# Altium footprint library Electronic Devices_LIB.PcbLib: 410 footprints (part 8 of 26)
Each footprint in its own frame and in the unit in brackets; x right, y up, seen from the top. Pads: shape width x height; smd on the part's side, far side on the other; paste and mask are expansions set on the pad; w line width, h text height; cw(c..) or ccw(c..) is an arc to the next point about the centre after c.
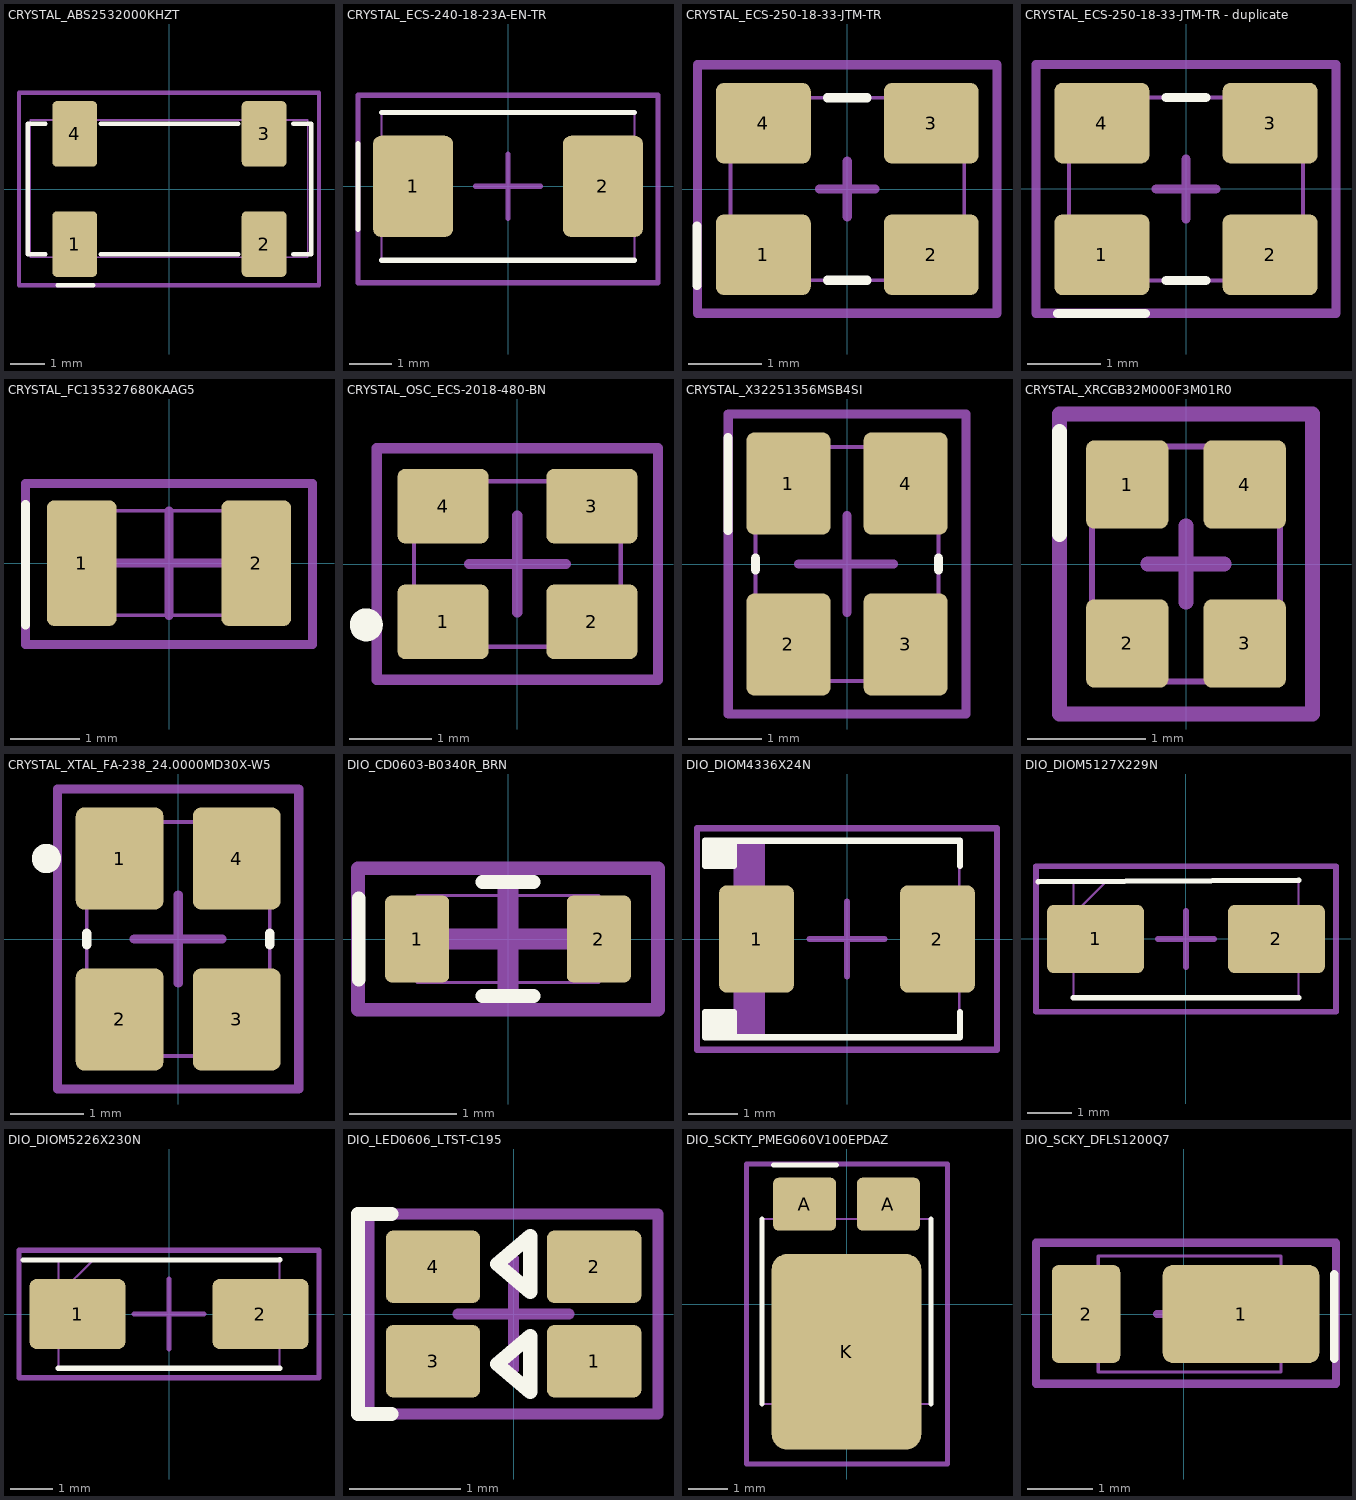
[diagram p7: the footprints below, top view; thin cyan lines are the x and y axes]

## CRYSTAL_ABS2532000KHZT [mm] "0.315\" L x 0.150\" W (8.00mm x 3.80mm)"
height 2.5
pads (4):
  rrect20% 1.3x1.9 smd: 1(-2.75,-1.6) 2(2.75,-1.6) 3(2.75,1.6) 4(-2.75,1.6)
Top Overlay:
  lines w0.127: -3.6,-1.9 -4.115,-1.9 -4.115,1.9 -3.6,1.9 ; -3.251,-2.794 -2.21,-2.794 ; -2,-1.9 2,-1.9 ; -2,1.9 2,1.9 ; 3.6,-1.9 4.115,-1.9 4.115,1.9 3.6,1.9
Top Assembly:
  lines w0.051: -4.039,-1.981 4.013,-1.981 4.013,2.007 -4.039,2.007 -4.039,-1.981
  text ".Designator" at -2.489,-0.136 h0.51
Top Courtyard:
  lines w0.127: -4.369,-2.794 -4.369,2.794 4.343,2.794 4.343,-2.794 -4.369,-2.794
3D body "ABS25-32.000KHZ-T.stp": height 1.25, standoff -1.41, extent -4,-2 4,2

## CRYSTAL_ECS-240-18-23A-EN-TR [mm]
pads (2):
  rrect20% 1.9x2.4 smd: 1(-2.25,0) 2(2.25,0)
Top Overlay:
  lines w0.127: -3.556,-1.016 -3.556,1.016 ; -3,-1.75 3,-1.75 ; -3,1.75 3,1.75
Top Assembly:
  lines w0.051: -3,-1.75 3,-1.75 3,1.75 -3,1.75 -3,-1.75
  text ".Designator" at -2.489,-0.034 h0.51
Top Courtyard:
  lines w0.127: -0.762,0 0,0 ; 0,-0.762 0,0 ; 0,0.762 0,0 ; 0.762,0 0,0 ; -3.556,-2.286 -3.556,2.159 3.556,2.159 3.556,-2.286 -3.556,-2.286
3D body "ECS-240-18-23A-EN-TR.STEP": height 1.11, standoff 0.01, extent -3,-1.75 3,1.75

## CRYSTAL_ECS-250-18-33-JTM-TR [mm] "0.126\" L x 0.098\" W (3.20mm x 2.50mm)"
height 0.8
pads (4):
  rrect20% 1.3x1.1 smd: 1(-1.15,-0.9) 2(1.15,-0.9) 3(1.15,0.9) 4(-1.15,0.9)
Top Overlay:
  lines w0.127: -2.057,-1.321 -2.057,-0.508 ; -0.27,-1.25 0.27,-1.25 ; -0.27,1.25 0.27,1.25
Top Assembly:
  lines w0.051: -1.6,-1.25 -1.6,1.25 1.6,1.25 1.6,-1.25 -1.6,-1.25
  text ".Designator" at -2.667,-0.186 h0.51
Top Courtyard:
  lines w0.127: -0.381,0 0,0 ; 0,-0.381 0,0 ; 0,0.381 0,0 ; 0.381,0 0,0 ; -2.05,-1.7 -2.05,1.7 2.05,1.7 2.05,-1.7 -2.05,-1.7
3D body "ECS-250-18-33-JTM-TR.STEP": height 0.81, standoff 0.01, extent -1.6,-1.25 1.6,1.25

## CRYSTAL_ECS-250-18-33-JTM-TR - duplicate [mm] "0.063\" L x 0.047\" W (1.60mm x 1.20mm)"
height 0.4
pads (4):
  rrect20% 1.3x1.1 smd: 1(-1.15,-0.9) 2(1.15,-0.9) 3(1.15,0.9) 4(-1.15,0.9)
Top Overlay:
  lines w0.127: -1.753,-1.702 -0.559,-1.702 ; -0.27,-1.25 0.27,-1.25 ; -0.27,1.25 0.27,1.25
Top Assembly:
  lines w0.051: -1.6,-1.25 1.6,-1.25 1.6,1.25 -1.6,1.25 -1.6,-1.25
  text ".Designator" at -2.667,-0.11 h0.51
Top Courtyard:
  lines w0.127: -0.406,0 0,0 ; 0,-0.406 0,0 ; 0,0.406 0,0 ; 0.406,0 0,0 ; -2.05,-1.7 2.05,-1.7 2.05,1.7 -2.05,1.7 -2.05,-1.7
3D body "ABM12W-40.0000MHZ-6-B1U-T3--3DModel-STEP-400430.STEP": height 0.41, standoff 0.01, extent -0.749,-0.6 0.851,0.6

## CRYSTAL_FC135327680KAAG5 [mm] "2-SMD, No Lead 0.126\" L x 0.059\" W (3.20mm x 1.50mm)"
height 0.9
pads (2):
  rrect20% 1x1.8 smd: 1(-1.25,0) 2(1.25,0)
Top Overlay:
  lines w0.127: -2.057,-0.889 -2.057,0.838
Top Assembly:
  lines w0.051: -1.6,-0.75 1.6,-0.75 1.6,0.75 -1.6,0.75 -1.6,-0.75
  text ".Designator" at -2.54,-0.136 h0.51
Top Courtyard:
  lines w0.127: -0.75,0 0,0 ; 0,-0.75 0,0 ; 0,0.75 0,0 ; 0.75,0 0,0 ; -2.057,-1.168 2.057,-1.168 2.057,1.143 -2.057,1.143 -2.057,-1.168
3D body "FC-135_32.7680KA-AG5.stp": height 0.9, standoff 0, extent -1.6,-0.75 1.6,0.75

## CRYSTAL_OSC_ECS-2018-480-BN [mm]
pads (4):
  rrect20% 1.1x0.9 smd: 1(-0.9,-0.7) 2(0.9,-0.7) 3(0.9,0.7) 4(-0.9,0.7)
Top Overlay:
  circle w0.2: c-1.829,-0.737 r0.1
Top Assembly:
  lines w0.051: -1.25,-1 -1.25,1 1.25,1 1.25,-1 -1.25,-1
  text ".Designator" at -2.565,-0.136 h0.51
Top Courtyard:
  lines w0.127: -0.584,0 0,0 ; 0,-0.584 0,0 ; 0,0.584 0,0 ; 0.584,0 0,0 ; -1.7,-1.4 1.7,-1.4 1.7,1.4 -1.7,1.4 -1.7,-1.4
3D body "step_temp.STEP": height 1, standoff 0, extent -1.25,-1 1.25,1

## CRYSTAL_X32251356MSB4SI [mm] "Dimensions:3.20 x 2.50 x 0.70 mm"
height 0.75
pads (4):
  rrect20% 1.15x1.4 smd: 1(-0.8,1.1) 2(-0.8,-1.1) 3(0.8,-1.1) 4(0.8,1.1)
Top Overlay:
  lines w0.127: -1.626,0.457 -1.626,1.727 ; -1.25,-0.08 -1.25,0.08 ; 1.25,-0.08 1.25,0.08
Top Assembly:
  lines w0.051: -1.25,-1.6 -1.25,1.6 1.25,1.6 1.25,-1.6 -1.25,-1.6
  text ".Designator" at -2.413,-0.136 h0.51
Top Courtyard:
  lines w0.127: -0.66,0 0,0 ; 0,-0.66 0,0 ; 0,0.66 0,0 ; 0.635,0 0,0 ; -1.625,-2.05 -1.625,2.05 1.625,2.05 1.625,-2.05 -1.625,-2.05
3D body "step_temp.STEP": height 0.75, standoff 0, extent -1.25,-1.6 1.25,1.6

## CRYSTAL_XRCGB32M000F3M01R0 [mm] "0.079\" L x 0.063\" W (2.00mm x 1.60mm)"
height 0.7
pads (4):
  rrect20% 0.7x0.75 smd: 1(-0.5,0.675) 2(-0.5,-0.675) 3(0.5,-0.675) 4(0.5,0.675)
Top Overlay:
  lines w0.127: -1.075,0.25 -1.075,1.125
Top Assembly:
  lines w0.051: -0.8,-1 0.8,-1 0.8,1 -0.8,1 -0.8,-1
  text ".Designator" at -2.499,-0.13 h0.51
Top Courtyard:
  lines w0.127: -0.325,0 0,0 ; 0,-0.325 0,0 ; 0,0.325 0,0 ; 0.325,0 0,0 ; -1.075,-1.275 -1.075,1.275 1.075,1.275 1.075,-1.275 -1.075,-1.275
3D body "step_temp.STEP": height 0.7, standoff 0, extent -0.8,-1 0.8,1

## CRYSTAL_XTAL_FA-238_24.0000MD30X-W5 [mm]
height 0.7
pads (4):
  rrect20% 1.2x1.4 smd: 1(-0.8,1.1) 2(-0.8,-1.1) 3(0.8,-1.1) 4(0.8,1.1)
Top Overlay:
  circle w0.2: c-1.8,1.1 r0.1
  lines w0.127: -1.25,-0.08 -1.25,0.08 ; 1.25,-0.08 1.25,0.08
Top Assembly:
  lines w0.051: -1.25,-1.6 -1.25,1.6 1.25,1.6 1.25,-1.6 -1.25,-1.6
Top Courtyard:
  lines w0.127: -0.6,0 0,0 ; 0,-0.6 0,0 ; 0,0.6 0,0 ; 0.6,0 0,0 ; -1.65,-2.05 -1.65,2.05 1.65,2.05 1.65,-2.05 -1.65,-2.05
3D body "step_temp.STEP": height 0.7, standoff 0, extent -1.25,-1.6 1.25,1.6

## DIO_CD0603-B0340R_BRN [mm]
pads (2):
  rrect20% 0.6x0.813 smd: 1(-0.85,0) 2(0.85,0)
Top Overlay:
  lines w0.127: -1.397,-0.381 -1.397,0.381 ; -0.242,-0.533 0.242,-0.533 ; -0.242,0.533 0.242,0.533
Top Assembly:
  text ".Designator" at -2.515,-0.186 h0.51
Top Courtyard:
  lines w0.127: -1.404,-0.66 -1.404,0.66 -1.105,0.66 1.105,0.66 1.404,0.66 1.404,-0.66 1.105,-0.66 -1.105,-0.66 -1.404,-0.66
  lines w0.2: -0.584,0 0,0 ; 0,-0.584 0,0 ; 0,0.584 0,0 ; 0.584,0 0,0
Top 3D Body:
  lines w0.025: -0.851,-0.406 0.851,-0.406 0.851,0.406 -0.851,0.406 -0.851,-0.406
3D body "CD0603-B0340R_BRN.step": height 0.81, standoff 0, extent -0.851,-0.409 0.851,0.409

## DIO_DIOM4336X24N [mm] "MoldeDiode, 2-Leads, Body 4.31x3.62mm, IPC Medium Density"
height 2.44
pads (2):
  rrect20% 1.52x2.18 smd: 1(-1.84,0) 2(1.839,0)
Top Overlay:
  rectangle: -2.889,1.49 -2.3,2
  rectangle: -2.889,-2 -2.3,-1.49
  lines w0.127: 2.3,-1.49 2.3,-2 -2.3,-2 ; 2.3,1.49 2.3,2 -2.3,2 ; -2.3,-2 -2.3,-1.49 -2.889,-1.49 -2.889,-2 -2.3,-2 ; -2.3,2 -2.3,1.49 -2.889,1.49 -2.889,2 -2.3,2
Top Assembly:
  rectangle: -2.285,-1.97 -1.67,1.97
  lines w0.051: -2.285,-1.97 -2.285,1.97 2.285,1.97 2.285,-1.97 -2.285,-1.97
  text ".Designator" at -2.87,-0.161 h0.51
Top Courtyard:
  lines w0.127: -0.762,0 0,0 ; 0,-0.762 0,0 ; 0,0.762 0,0 ; 0.762,0 0,0 ; -3.05,-2.25 -3.05,2.25 3.05,2.25 3.05,-2.25 -3.05,-2.25
3D body "DIOM4336X24N.step": height 2.44, standoff 0, extent -2.505,-1.97 2.505,1.97

## DIO_DIOM5127X229N [mm] "DO-214AC, SMA"
height 2.25
pads (2):
  rrect20% 2.2x1.55 smd: 1(-2.05,0) 2(2.05,0)
Top Overlay:
  lines w0.127: -3.353,1.295 2.552,1.332 ; -2.552,-1.332 2.552,-1.332
Top Assembly:
  text ".Designator" at -2.54,-0.161 h0.51
Top Courtyard:
  lines w0.127: -0.635,0 0,0 ; 0,-0.635 0,0 ; 0,0.635 0,0 ; 0.635,0 0,0 ; -3.4,-1.645 -3.4,1.645 3.4,1.645 3.4,-1.645 -3.4,-1.645
Top 3D Body:
  lines w0.051: -2.552,0.558 -1.778,1.332 ; -2.552,-1.332 -2.552,1.332 2.552,1.332 2.552,-1.332 -2.552,-1.332
3D body "SMAJ5.0A-E3_5A.stp": height 2.29, standoff 0, extent -2.552,-1.332 2.552,1.332

## DIO_DIOM5226X230N [mm] "DO-214AC, SMA"
height 2.9
pads (2):
  rrect20% 2.25x1.65 smd: 1(-2.15,0) 2(2.15,0)
Top Overlay:
  lines w0.127: -3.429,1.27 2.6,1.275 ; -2.6,-1.275 2.6,-1.275
Top Assembly:
  lines w0.051: -2.6,0.45 -1.775,1.275 ; -2.6,-1.275 -2.6,1.275 2.6,1.275 2.6,-1.275 -2.6,-1.275
  text ".Designator" at -2.438,-0.136 h0.51
Top Courtyard:
  lines w0.127: -0.813,0 0,0 ; 0,-0.813 0,0 ; 0,0.813 0,0 ; 0.813,0 0,0 ; -3.525,-1.499 -3.525,1.499 3.525,1.499 3.525,-1.499 -3.525,-1.499
3D body "S1A-E3_61T.stp": height 2.3, standoff 0, extent -2.6,-1.25 2.6,1.3

## DIO_LED0606_LTST-C195 [mm] "Lite-On LED, body 1.60mm L x 1.50mm / 0606 (1616 Metric)"
height 0.8
pads (4):
  rrect20% 0.85x0.65 smd: 1(0.725,-0.425) 2(0.725,0.425) 3(-0.725,-0.425) 4(-0.725,0.425)
Top Overlay:
  lines w0.127: -1.1,-0.9 -1.4,-0.9 -1.4,0.9 -1.1,0.9 ; -0.15,-0.45 0.15,-0.7 0.15,-0.2 -0.15,-0.45 ; -0.15,0.45 0.15,0.7 0.15,0.2 -0.15,0.45
Top Assembly:
  text ".Designator" at -2.54,-0.212 h0.51
Top Courtyard:
  lines w0.1: -0.5,0 0.5,0 ; 0,-0.5 0,0.5 ; -1.3,-0.9 1.3,-0.9 1.3,0.9 -1.3,0.9 -1.3,-0.9
3D body "150060xxx.stp": height 0.7, standoff 0, extent -0.8,0 0.8,0.8
3D body: height 0.7, standoff 0.7, extent -0.443,0.1 0.446,0.7
3D body "150060xxx.stp": height 0.7, standoff 0, extent -0.8,-0.8 0.8,0
3D body: height 0.7, standoff 0.7, extent -0.443,-0.7 0.446,-0.1

## DIO_SCKTY_PMEG060V100EPDAZ [mm] "SOT1289"
height 0.82
pads (3):
  rrect20% 1.6x1.34 smd: A(-1.065,2.537) A(1.065,2.537)
  rrect20% 3.8x4.96 smd: K(0,-1.213)
Top Overlay:
  lines w0.127: -2.15,-2.538 -2.15,2.162 ; -1.854,3.531 -0.254,3.531 ; 2.15,-2.538 2.15,2.162
Top Assembly:
  lines w0.051: -2.15,-2.538 2.15,-2.538 2.15,2.162 -2.15,2.162 -2.15,-2.538
  text ".Designator" at -2.388,-0.44 h0.51
Top Courtyard:
  lines w0.127: -0.762,0 0,0 ; 0,-0.762 0,0 ; 0,0.762 0,0 ; 0.762,0 0,0 ; -2.54,-4.064 2.565,-4.064 2.565,3.556 -2.54,3.556 -2.54,-4.064
3D body "PMEG100V060ELPDZ.stp": height 0.8, standoff 0, extent -2.225,-3.494 2.225,3.006

## DIO_SCKY_DFLS1200Q7 [mm] "POWERDI 123"
height 1
pads (2):
  rrect20% 2.4x1.5 smd: 1(0.881,0)
  rrect20% 1.05x1.5 smd: 2(-1.494,0)
Top Overlay:
  lines w0.127: 2.311,-0.686 2.311,0.61
Top Assembly:
  lines w0.051: -1.306,-0.89 1.494,-0.89 1.494,0.89 -1.306,0.89 -1.306,-0.89
  text ".Designator" at -2.489,-0.161 h0.51
Top Courtyard:
  lines w0.127: -0.406,0 0,0 ; 0,-0.406 0,0 ; 0,0.406 0,0 ; 0.406,0 0,0 ; -2.261,-1.067 2.337,-1.067 2.337,1.092 -2.261,1.092 -2.261,-1.067
3D body "DFLS1200Q-7.stp": height 1.08, standoff 0, extent -1.914,-0.89 1.931,0.89